# Altium schematic symbol library MCU_Microchip_ATmega.SchLib: 440 symbols (part 8 of 9) (continued)
## ATxmega64D4-A (continued)
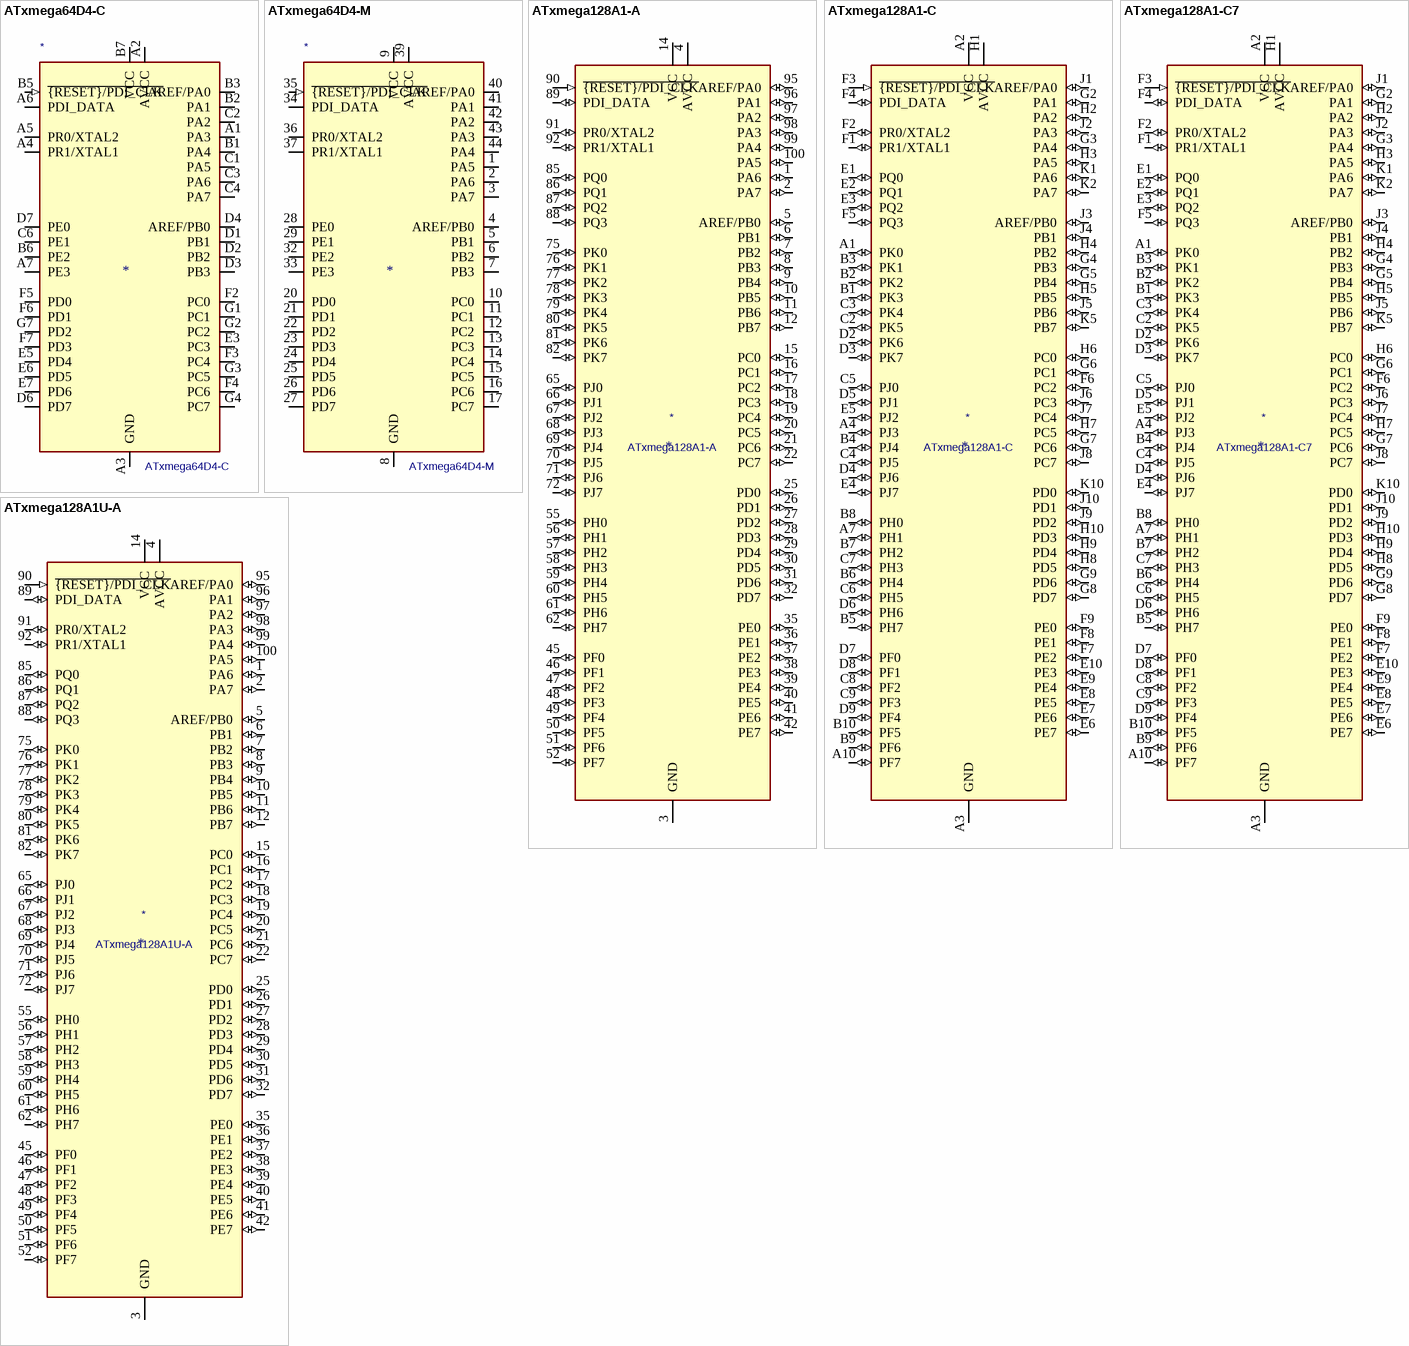
[diagram p35: symbols ATxmega64D4-C to ATxmega128A1U-A]

## ATxmega64D4-C
designator *  value ATxmega64D4-C
ki_keywords: AVR 8/16bit Microcontroller XMegaAVR; ki_description: 32MHz, 64kB Flash, 4kB Boot, 4kB SRAM, 2kB EEPROM, JTAG, VFBGA-49; ki_fp_filters: VFBGA*5.0x5.0mm*Layout7x7*P0.65mm*; Footprint: Package_BGA:VFBGA-49_5.0x5.0mm_Layout7x7_P0.65mm; Supplier: http://ww1.microchip.com/downloads/en/DeviceDoc/Atmel-8135-8-and-16-bit-AVR-microcontroller-ATxmega16D4-32D4-64D4-128D4_datasheet.pdf
footprint VFBGA-49_5.0x5.0mm_Layout7x7_P0.65mm
pins: A1 PA3 (io), A2 AVCC (power), A3 GND (power), A4 PR1/XTAL1 (io), A5 PR0/XTAL2 (io), A6 PDI_DATA (io), A7 PE3 (io), B1 PA4 (io), B2 PA1 (io), B3 AREF/PA0 (io), B4 GND hidden, B5 ~{{RESET}/PDI_CLK} (in), B6 PE2 (io), B7 VCC (power), C1 PA5 (io), C2 PA2 (io), C3 PA6 (io), C4 PA7 (io), C5 GND hidden, C6 PE1 (io), C7 GND hidden, D1 PB1 (io), D2 PB2 (io), D3 PB3 (io), D4 AREF/PB0 (io), D5 GND hidden, D6 PD7 (io), D7 PE0 (io), E1 GND hidden, E2 GND hidden, E3 PC3 (io), E4 GND hidden, E5 PD4 (io), E6 PD5 (io), E7 PD6 (io), F1 VCC hidden, F2 PC0 (io), F3 PC4 (io), F4 PC6 (io), F5 PD0 (io), F6 PD1 (io), F7 PD3 (io), G1 PC1 (io), G2 PC2 (io), G3 PC5 (io), G4 PC7 (io), G5 GND hidden, G6 VCC hidden, G7 PD2 (io)

## ATxmega64D4-M
designator *  value ATxmega64D4-M
ki_keywords: AVR 8/16bit Microcontroller XMegaAVR; ki_description: 32MHz, 64kB Flash, 4kB Boot, 4kB SRAM, 2kB EEPROM, JTAG, QFN-44; ki_fp_filters: QFN*1EP*7x7mm*P0.5mm*; Footprint: Package_DFN_QFN:QFN-44-1EP_7x7mm_P0.5mm_EP5.2x5.2mm; Supplier: http://ww1.microchip.com/downloads/en/DeviceDoc/Atmel-8135-8-and-16-bit-AVR-microcontroller-ATxmega16D4-32D4-64D4-128D4_datasheet.pdf
footprint QFN-44-1EP_7x7mm_P0.5mm_EP5.2x5.2mm
pins: 1 PA5 (io), 2 PA6 (io), 3 PA7 (io), 4 AREF/PB0 (io), 5 PB1 (io), 6 PB2 (io), 7 PB3 (io), 8 GND (power), 9 VCC (power), 10 PC0 (io), 11 PC1 (io), 12 PC2 (io), 13 PC3 (io), 14 PC4 (io), 15 PC5 (io), 16 PC6 (io), 17 PC7 (io), 18 GND hidden, 19 VCC hidden, 20 PD0 (io), 21 PD1 (io), 22 PD2 (io), 23 PD3 (io), 24 PD4 (io), 25 PD5 (io), 26 PD6 (io), 27 PD7 (io), 28 PE0 (io), 29 PE1 (io), 30 GND hidden, 31 VCC hidden, 32 PE2 (io), 33 PE3 (io), 34 PDI_DATA (io), 35 ~{{RESET}/PDI_CLK} (in), 36 PR0/XTAL2 (io), 37 PR1/XTAL1 (io), 38 GND hidden, 39 AVCC (power), 40 AREF/PA0 (io), 41 PA1 (io), 42 PA2 (io), 43 PA3 (io), 44 PA4 (io), 45 GND hidden

## ATxmega128A1-A
designator *  value ATxmega128A1-A
ki_keywords: AVR 8/16bit Microcontroller XMegaAVR; ki_description: 32MHz, 128kB Flash, 8kB Boot, 8kB SRAM, 2kB EEPROM, JTAG, TQFP-100; ki_fp_filters: TQFP*14x14mm*P0.5mm*; Footprint: Package_QFP:TQFP-100_14x14mm_P0.5mm; Supplier: http://ww1.microchip.com/downloads/en/DeviceDoc/Atmel-8067-8-and-16-bit-AVR-Microcontrollers-ATxmega64A1-ATxmega128A1_Datasheet.pdf
footprint TQFP-100_14x14mm_P0.5mm
pins: 1 PA6 (io), 2 PA7 (io), 3 GND (power), 4 AVCC (power), 5 AREF/PB0 (io), 6 PB1 (io), 7 PB2 (io), 8 PB3 (io), 9 PB4 (io), 10 PB5 (io), 11 PB6 (io), 12 PB7 (io), 13 GND hidden, 14 VCC (power), 15 PC0 (io), 16 PC1 (io), 17 PC2 (io), 18 PC3 (io), 19 PC4 (io), 20 PC5 (io), 21 PC6 (io), 22 PC7 (io), 23 GND hidden, 24 VCC hidden, 25 PD0 (io), 26 PD1 (io), 27 PD2 (io), 28 PD3 (io), 29 PD4 (io), 30 PD5 (io), 31 PD6 (io), 32 PD7 (io), 33 GND hidden, 34 VCC hidden, 35 PE0 (io), 36 PE1 (io), 37 PE2 (io), 38 PE3 (io), 39 PE4 (io), 40 PE5 (io), 41 PE6 (io), 42 PE7 (io), 43 GND hidden, 44 VCC hidden, 45 PF0 (io), 46 PF1 (io), 47 PF2 (io), 48 PF3 (io), 49 PF4 (io), 50 PF5 (io), 51 PF6 (io), 52 PF7 (io), 53 GND hidden, 54 VCC hidden, 55 PH0 (io), 56 PH1 (io), 57 PH2 (io), 58 PH3 (io), 59 PH4 (io), 60 PH5 (io), 61 PH6 (io), 62 PH7 (io), 63 GND hidden, 64 VCC hidden, 65 PJ0 (io), 66 PJ1 (io), 67 PJ2 (io), 68 PJ3 (io), 69 PJ4 (io), 70 PJ5 (io), 71 PJ6 (io), 72 PJ7 (io), 73 GND hidden, 74 VCC hidden, 75 PK0 (io), 76 PK1 (io), 77 PK2 (io), 78 PK3 (io), 79 PK4 (io), 80 PK5 (io), 81 PK6 (io), 82 PK7 (io), 83 VCC hidden, 84 GND hidden, 85 PQ0 (io), 86 PQ1 (io), 87 PQ2 (io), 88 PQ3 (io), 89 PDI_DATA (io), 90 ~{{RESET}/PDI_CLK} (in), 91 PR0/XTAL2 (io), 92 PR1/XTAL1 (io), 93 GND hidden, 94 AVCC hidden, 95 AREF/PA0 (io), 96 PA1 (io), 97 PA2 (io), 98 PA3 (io), 99 PA4 (io), 100 PA5 (io)

## ATxmega128A1-C
designator *  value ATxmega128A1-C
ki_keywords: AVR 8/16bit Microcontroller XMegaAVR; ki_description: 32MHz, 128kB Flash, 8kB Boot, 8kB SRAM, 2kB EEPROM, JTAG, TFBGA-100; ki_fp_filters: TFBGA*9.0x9.0mm*Layout10x10*P0.8mm*; Footprint: Package_BGA:TFBGA-100_9.0x9.0mm_Layout10x10_P0.8mm; Supplier: http://ww1.microchip.com/downloads/en/DeviceDoc/Atmel-8067-8-and-16-bit-AVR-Microcontrollers-ATxmega64A1-ATxmega128A1_Datasheet.pdf
footprint TFBGA-100_9.0x9.0mm_Layout10x10_P0.8mm
pins: A1 PK0 (io), A2 VCC (power), A3 GND (power), A4 PJ3 (io), A5 VCC hidden, A6 GND hidden, A7 PH1 (io), A8 GND hidden, A9 VCC hidden, A10 PF7 (io), B1 PK3 (io), B2 PK2 (io), B3 PK1 (io), B4 PJ4 (io), B5 PH7 (io), B6 PH4 (io), B7 PH2 (io), B8 PH0 (io), B9 PF6 (io), B10 PF5 (io), C1 VCC hidden, C2 PK5 (io), C3 PK4 (io), C4 PJ5 (io), C5 PJ0 (io), C6 PH5 (io), C7 PH3 (io), C8 PF2 (io), C9 PF3 (io), C10 VCC hidden, D1 GND hidden, D2 PK6 (io), D3 PK7 (io), D4 PJ6 (io), D5 PJ1 (io), D6 PH6 (io), D7 PF0 (io), D8 PF1 (io), D9 PF4 (io), D10 GND hidden, E1 PQ0 (io), E2 PQ1 (io), E3 PQ2 (io), E4 PJ7 (io), E5 PJ2 (io), E6 PE7 (io), E7 PE6 (io), E8 PE5 (io), E9 PE4 (io), E10 PE3 (io), F1 PR1/XTAL1 (io), F2 PR0/XTAL2 (io), F3 ~{{RESET}/PDI_CLK} (in), F4 PDI_DATA (io), F5 PQ3 (io), F6 PC2 (io), F7 PE2 (io), F8 PE1 (io), F9 PE0 (io), F10 VCC hidden, G1 GND hidden, G2 PA1 (io), G3 PA4 (io), G4 PB3 (io), G5 PB4 (io), G6 PC1 (io), G7 PC6 (io), G8 PD7 (io), G9 PD6 (io), G10 GND hidden, H1 AVCC (power), H2 PA2 (io), H3 PA5 (io), H4 PB2 (io), H5 PB5 (io), H6 PC0 (io), H7 PC5 (io), H8 PD5 (io), H9 PD4 (io), H10 PD3 (io), J1 AREF/PA0 (io), J2 PA3 (io), J3 AREF/PB0 (io), J4 PB1 (io), J5 PB6 (io), J6 PC3 (io), J7 PC4 (io), J8 PC7 (io), J9 PD2 (io), J10 PD1 (io), K1 PA6 (io), K2 PA7 (io), K3 GND hidden, K4 AVCC hidden, K5 PB7 (io), K6 VCC hidden, K7 GND hidden, K8 VCC hidden, K9 GND hidden, K10 PD0 (io)

## ATxmega128A1-C7
designator *  value ATxmega128A1-C7
ki_keywords: AVR 8/16bit Microcontroller XMegaAVR; ki_description: 32MHz, 128kB Flash, 8kB Boot, 8kB SRAM, 2kB EEPROM, JTAG, VFBGA-100; ki_fp_filters: VFBGA*7.0x7.0mm*Layout10x10*P0.65mm*; Footprint: Package_BGA:VFBGA-100_7.0x7.0mm_Layout10x10_P0.65mm; Supplier: http://ww1.microchip.com/downloads/en/DeviceDoc/Atmel-8067-8-and-16-bit-AVR-Microcontrollers-ATxmega64A1-ATxmega128A1_Datasheet.pdf
footprint VFBGA-100_7.0x7.0mm_Layout10x10_P0.65mm
pins: A1 PK0 (io), A2 VCC (power), A3 GND (power), A4 PJ3 (io), A5 VCC hidden, A6 GND hidden, A7 PH1 (io), A8 GND hidden, A9 VCC hidden, A10 PF7 (io), B1 PK3 (io), B2 PK2 (io), B3 PK1 (io), B4 PJ4 (io), B5 PH7 (io), B6 PH4 (io), B7 PH2 (io), B8 PH0 (io), B9 PF6 (io), B10 PF5 (io), C1 VCC hidden, C2 PK5 (io), C3 PK4 (io), C4 PJ5 (io), C5 PJ0 (io), C6 PH5 (io), C7 PH3 (io), C8 PF2 (io), C9 PF3 (io), C10 VCC hidden, D1 GND hidden, D2 PK6 (io), D3 PK7 (io), D4 PJ6 (io), D5 PJ1 (io), D6 PH6 (io), D7 PF0 (io), D8 PF1 (io), D9 PF4 (io), D10 GND hidden, E1 PQ0 (io), E2 PQ1 (io), E3 PQ2 (io), E4 PJ7 (io), E5 PJ2 (io), E6 PE7 (io), E7 PE6 (io), E8 PE5 (io), E9 PE4 (io), E10 PE3 (io), F1 PR1/XTAL1 (io), F2 PR0/XTAL2 (io), F3 ~{{RESET}/PDI_CLK} (in), F4 PDI_DATA (io), F5 PQ3 (io), F6 PC2 (io), F7 PE2 (io), F8 PE1 (io), F9 PE0 (io), F10 VCC hidden, G1 GND hidden, G2 PA1 (io), G3 PA4 (io), G4 PB3 (io), G5 PB4 (io), G6 PC1 (io), G7 PC6 (io), G8 PD7 (io), G9 PD6 (io), G10 GND hidden, H1 AVCC (power), H2 PA2 (io), H3 PA5 (io), H4 PB2 (io), H5 PB5 (io), H6 PC0 (io), H7 PC5 (io), H8 PD5 (io), H9 PD4 (io), H10 PD3 (io), J1 AREF/PA0 (io), J2 PA3 (io), J3 AREF/PB0 (io), J4 PB1 (io), J5 PB6 (io), J6 PC3 (io), J7 PC4 (io), J8 PC7 (io), J9 PD2 (io), J10 PD1 (io), K1 PA6 (io), K2 PA7 (io), K3 GND hidden, K4 AVCC hidden, K5 PB7 (io), K6 VCC hidden, K7 GND hidden, K8 VCC hidden, K9 GND hidden, K10 PD0 (io)

## ATxmega128A1U-A
designator *  value ATxmega128A1U-A
ki_keywords: AVR 8/16bit Microcontroller XMegaAVR; ki_description: 32MHz, 128kB Flash, 8kB Boot, 8kB SRAM, 2kB EEPROM, JTAG, USB, TQFP-100; ki_fp_filters: TQFP*14x14mm*P0.5mm*; Footprint: Package_QFP:TQFP-100_14x14mm_P0.5mm; Supplier: http://ww1.microchip.com/downloads/en/DeviceDoc/Atmel-8385-8-and-16-bit-AVR-Microcontroller-ATxmega64A1U-ATxmega128A1U_datasheet.pdf
footprint TQFP-100_14x14mm_P0.5mm
pins: 1 PA6 (io), 2 PA7 (io), 3 GND (power), 4 AVCC (power), 5 AREF/PB0 (io), 6 PB1 (io), 7 PB2 (io), 8 PB3 (io), 9 PB4 (io), 10 PB5 (io), 11 PB6 (io), 12 PB7 (io), 13 GND hidden, 14 VCC (power), 15 PC0 (io), 16 PC1 (io), 17 PC2 (io), 18 PC3 (io), 19 PC4 (io), 20 PC5 (io), 21 PC6 (io), 22 PC7 (io), 23 GND hidden, 24 VCC hidden, 25 PD0 (io), 26 PD1 (io), 27 PD2 (io), 28 PD3 (io), 29 PD4 (io), 30 PD5 (io), 31 PD6 (io), 32 PD7 (io), 33 GND hidden, 34 VCC hidden, 35 PE0 (io), 36 PE1 (io), 37 PE2 (io), 38 PE3 (io), 39 PE4 (io), 40 PE5 (io), 41 PE6 (io), 42 PE7 (io), 43 GND hidden, 44 VCC hidden, 45 PF0 (io), 46 PF1 (io), 47 PF2 (io), 48 PF3 (io), 49 PF4 (io), 50 PF5 (io), 51 PF6 (io), 52 PF7 (io), 53 GND hidden, 54 VCC hidden, 55 PH0 (io), 56 PH1 (io), 57 PH2 (io), 58 PH3 (io), 59 PH4 (io), 60 PH5 (io), 61 PH6 (io), 62 PH7 (io), 63 GND hidden, 64 VCC hidden, 65 PJ0 (io), 66 PJ1 (io), 67 PJ2 (io), 68 PJ3 (io), 69 PJ4 (io), 70 PJ5 (io), 71 PJ6 (io), 72 PJ7 (io), 73 GND hidden, 74 VCC hidden, 75 PK0 (io), 76 PK1 (io), 77 PK2 (io), 78 PK3 (io), 79 PK4 (io), 80 PK5 (io), 81 PK6 (io), 82 PK7 (io), 83 VCC hidden, 84 GND hidden, 85 PQ0 (io), 86 PQ1 (io), 87 PQ2 (io), 88 PQ3 (io), 89 PDI_DATA (io), 90 ~{{RESET}/PDI_CLK} (in), 91 PR0/XTAL2 (io), 92 PR1/XTAL1 (io), 93 GND hidden, 94 AVCC hidden, 95 AREF/PA0 (io), 96 PA1 (io), 97 PA2 (io), 98 PA3 (io), 99 PA4 (io), 100 PA5 (io)

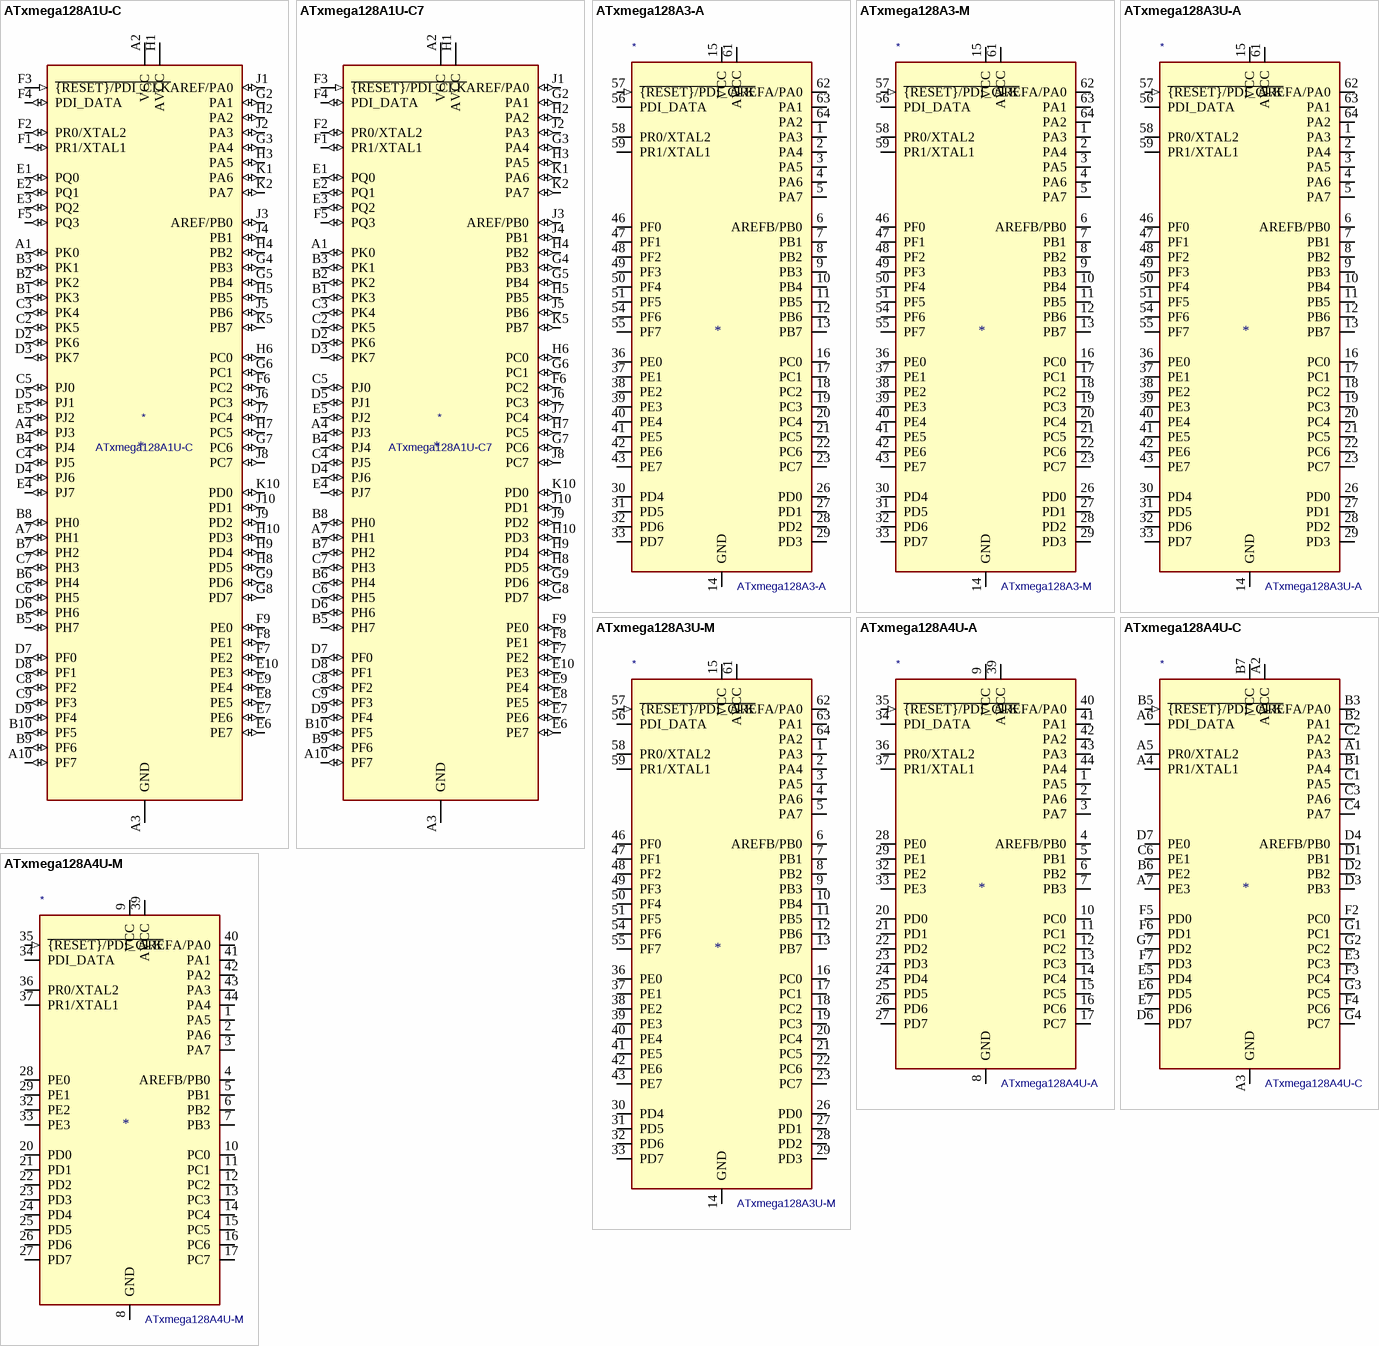
[diagram p36: symbols ATxmega128A1U-C to ATxmega128A4U-M]

## ATxmega128A1U-C
designator *  value ATxmega128A1U-C
ki_keywords: AVR 8/16bit Microcontroller XMegaAVR; ki_description: 32MHz, 128kB Flash, 8kB Boot, 8kB SRAM, 2kB EEPROM, JTAG, USB, TFBGA-100; ki_fp_filters: TFBGA*9.0x9.0mm*Layout10x10*P0.8mm*; Footprint: Package_BGA:TFBGA-100_9.0x9.0mm_Layout10x10_P0.8mm; Supplier: http://ww1.microchip.com/downloads/en/DeviceDoc/Atmel-8385-8-and-16-bit-AVR-Microcontroller-ATxmega64A1U-ATxmega128A1U_datasheet.pdf
footprint TFBGA-100_9.0x9.0mm_Layout10x10_P0.8mm
pins: A1 PK0 (io), A2 VCC (power), A3 GND (power), A4 PJ3 (io), A5 VCC hidden, A6 GND hidden, A7 PH1 (io), A8 GND hidden, A9 VCC hidden, A10 PF7 (io), B1 PK3 (io), B2 PK2 (io), B3 PK1 (io), B4 PJ4 (io), B5 PH7 (io), B6 PH4 (io), B7 PH2 (io), B8 PH0 (io), B9 PF6 (io), B10 PF5 (io), C1 VCC hidden, C2 PK5 (io), C3 PK4 (io), C4 PJ5 (io), C5 PJ0 (io), C6 PH5 (io), C7 PH3 (io), C8 PF2 (io), C9 PF3 (io), C10 VCC hidden, D1 GND hidden, D2 PK6 (io), D3 PK7 (io), D4 PJ6 (io), D5 PJ1 (io), D6 PH6 (io), D7 PF0 (io), D8 PF1 (io), D9 PF4 (io), D10 GND hidden, E1 PQ0 (io), E2 PQ1 (io), E3 PQ2 (io), E4 PJ7 (io), E5 PJ2 (io), E6 PE7 (io), E7 PE6 (io), E8 PE5 (io), E9 PE4 (io), E10 PE3 (io), F1 PR1/XTAL1 (io), F2 PR0/XTAL2 (io), F3 ~{{RESET}/PDI_CLK} (in), F4 PDI_DATA (io), F5 PQ3 (io), F6 PC2 (io), F7 PE2 (io), F8 PE1 (io), F9 PE0 (io), F10 VCC hidden, G1 GND hidden, G2 PA1 (io), G3 PA4 (io), G4 PB3 (io), G5 PB4 (io), G6 PC1 (io), G7 PC6 (io), G8 PD7 (io), G9 PD6 (io), G10 GND hidden, H1 AVCC (power), H2 PA2 (io), H3 PA5 (io), H4 PB2 (io), H5 PB5 (io), H6 PC0 (io), H7 PC5 (io), H8 PD5 (io), H9 PD4 (io), H10 PD3 (io), J1 AREF/PA0 (io), J2 PA3 (io), J3 AREF/PB0 (io), J4 PB1 (io), J5 PB6 (io), J6 PC3 (io), J7 PC4 (io), J8 PC7 (io), J9 PD2 (io), J10 PD1 (io), K1 PA6 (io), K2 PA7 (io), K3 GND hidden, K4 AVCC hidden, K5 PB7 (io), K6 VCC hidden, K7 GND hidden, K8 VCC hidden, K9 GND hidden, K10 PD0 (io)

## ATxmega128A1U-C7
designator *  value ATxmega128A1U-C7
ki_keywords: AVR 8/16bit Microcontroller XMegaAVR; ki_description: 32MHz, 128kB Flash, 8kB Boot, 8kB SRAM, 2kB EEPROM, JTAG, USB, VFBGA-100; ki_fp_filters: VFBGA*7.0x7.0mm*Layout10x10*P0.65mm*; Footprint: Package_BGA:VFBGA-100_7.0x7.0mm_Layout10x10_P0.65mm; Supplier: http://ww1.microchip.com/downloads/en/DeviceDoc/Atmel-8385-8-and-16-bit-AVR-Microcontroller-ATxmega64A1U-ATxmega128A1U_datasheet.pdf
footprint VFBGA-100_7.0x7.0mm_Layout10x10_P0.65mm
pins: A1 PK0 (io), A2 VCC (power), A3 GND (power), A4 PJ3 (io), A5 VCC hidden, A6 GND hidden, A7 PH1 (io), A8 GND hidden, A9 VCC hidden, A10 PF7 (io), B1 PK3 (io), B2 PK2 (io), B3 PK1 (io), B4 PJ4 (io), B5 PH7 (io), B6 PH4 (io), B7 PH2 (io), B8 PH0 (io), B9 PF6 (io), B10 PF5 (io), C1 VCC hidden, C2 PK5 (io), C3 PK4 (io), C4 PJ5 (io), C5 PJ0 (io), C6 PH5 (io), C7 PH3 (io), C8 PF2 (io), C9 PF3 (io), C10 VCC hidden, D1 GND hidden, D2 PK6 (io), D3 PK7 (io), D4 PJ6 (io), D5 PJ1 (io), D6 PH6 (io), D7 PF0 (io), D8 PF1 (io), D9 PF4 (io), D10 GND hidden, E1 PQ0 (io), E2 PQ1 (io), E3 PQ2 (io), E4 PJ7 (io), E5 PJ2 (io), E6 PE7 (io), E7 PE6 (io), E8 PE5 (io), E9 PE4 (io), E10 PE3 (io), F1 PR1/XTAL1 (io), F2 PR0/XTAL2 (io), F3 ~{{RESET}/PDI_CLK} (in), F4 PDI_DATA (io), F5 PQ3 (io), F6 PC2 (io), F7 PE2 (io), F8 PE1 (io), F9 PE0 (io), F10 VCC hidden, G1 GND hidden, G2 PA1 (io), G3 PA4 (io), G4 PB3 (io), G5 PB4 (io), G6 PC1 (io), G7 PC6 (io), G8 PD7 (io), G9 PD6 (io), G10 GND hidden, H1 AVCC (power), H2 PA2 (io), H3 PA5 (io), H4 PB2 (io), H5 PB5 (io), H6 PC0 (io), H7 PC5 (io), H8 PD5 (io), H9 PD4 (io), H10 PD3 (io), J1 AREF/PA0 (io), J2 PA3 (io), J3 AREF/PB0 (io), J4 PB1 (io), J5 PB6 (io), J6 PC3 (io), J7 PC4 (io), J8 PC7 (io), J9 PD2 (io), J10 PD1 (io), K1 PA6 (io), K2 PA7 (io), K3 GND hidden, K4 AVCC hidden, K5 PB7 (io), K6 VCC hidden, K7 GND hidden, K8 VCC hidden, K9 GND hidden, K10 PD0 (io)

## ATxmega128A3-A
designator *  value ATxmega128A3-A
ki_keywords: AVR 8/16bit Microcontroller XMegaAVR; ki_description: 32MHz, 128kB Flash, 8kB Boot, 8kB SRAM, 2kB EEPROM, JTAG, TQFP-64; ki_fp_filters: TQFP*14x14mm*P0.8mm*; Footprint: Package_QFP:TQFP-64_14x14mm_P0.8mm; Supplier: http://ww1.microchip.com/downloads/en/DeviceDoc/Atmel-8068-8-and16-bit-AVR-XMEGA-A3-Microcontrollers_Datasheet.pdf
footprint TQFP-64_14x14mm_P0.8mm
pins: 1 PA3 (io), 2 PA4 (io), 3 PA5 (io), 4 PA6 (io), 5 PA7 (io), 6 AREFB/PB0 (io), 7 PB1 (io), 8 PB2 (io), 9 PB3 (io), 10 PB4 (io), 11 PB5 (io), 12 PB6 (io), 13 PB7 (io), 14 GND (power), 15 VCC (power), 16 PC0 (io), 17 PC1 (io), 18 PC2 (io), 19 PC3 (io), 20 PC4 (io), 21 PC5 (io), 22 PC6 (io), 23 PC7 (io), 24 GND hidden, 25 VCC hidden, 26 PD0 (io), 27 PD1 (io), 28 PD2 (io), 29 PD3 (io), 30 PD4 (io), 31 PD5 (io), 32 PD6 (io), 33 PD7 (io), 34 GND hidden, 35 VCC hidden, 36 PE0 (io), 37 PE1 (io), 38 PE2 (io), 39 PE3 (io), 40 PE4 (io), 41 PE5 (io), 42 PE6 (io), 43 PE7 (io), 44 GND hidden, 45 VCC hidden, 46 PF0 (io), 47 PF1 (io), 48 PF2 (io), 49 PF3 (io), 50 PF4 (io), 51 PF5 (io), 52 GND hidden, 53 VCC hidden, 54 PF6 (io), 55 PF7 (io), 56 PDI_DATA (io), 57 ~{{RESET}/PDI_CLK} (in), 58 PR0/XTAL2 (io), 59 PR1/XTAL1 (io), 60 GND hidden, 61 AVCC (power), 62 AREFA/PA0 (io), 63 PA1 (io), 64 PA2 (io)

## ATxmega128A3-M
designator *  value ATxmega128A3-M
ki_keywords: AVR 8/16bit Microcontroller XMegaAVR; ki_description: 32MHz, 128kB Flash, 8kB Boot, 8kB SRAM, 2kB EEPROM, JTAG, QFN-64; ki_fp_filters: QFN*1EP*9x9mm*P0.5mm*; Footprint: Package_DFN_QFN:QFN-64-1EP_9x9mm_P0.5mm_EP7.65x7.65mm; Supplier: http://ww1.microchip.com/downloads/en/DeviceDoc/Atmel-8068-8-and16-bit-AVR-XMEGA-A3-Microcontrollers_Datasheet.pdf
footprint QFN-64-1EP_9x9mm_P0.5mm_EP7.65x7.65mm
pins: 1 PA3 (io), 2 PA4 (io), 3 PA5 (io), 4 PA6 (io), 5 PA7 (io), 6 AREFB/PB0 (io), 7 PB1 (io), 8 PB2 (io), 9 PB3 (io), 10 PB4 (io), 11 PB5 (io), 12 PB6 (io), 13 PB7 (io), 14 GND (power), 15 VCC (power), 16 PC0 (io), 17 PC1 (io), 18 PC2 (io), 19 PC3 (io), 20 PC4 (io), 21 PC5 (io), 22 PC6 (io), 23 PC7 (io), 24 GND hidden, 25 VCC hidden, 26 PD0 (io), 27 PD1 (io), 28 PD2 (io), 29 PD3 (io), 30 PD4 (io), 31 PD5 (io), 32 PD6 (io), 33 PD7 (io), 34 GND hidden, 35 VCC hidden, 36 PE0 (io), 37 PE1 (io), 38 PE2 (io), 39 PE3 (io), 40 PE4 (io), 41 PE5 (io), 42 PE6 (io), 43 PE7 (io), 44 GND hidden, 45 VCC hidden, 46 PF0 (io), 47 PF1 (io), 48 PF2 (io), 49 PF3 (io), 50 PF4 (io), 51 PF5 (io), 52 GND hidden, 53 VCC hidden, 54 PF6 (io), 55 PF7 (io), 56 PDI_DATA (io), 57 ~{{RESET}/PDI_CLK} (in), 58 PR0/XTAL2 (io), 59 PR1/XTAL1 (io), 60 GND hidden, 61 AVCC (power), 62 AREFA/PA0 (io), 63 PA1 (io), 64 PA2 (io), 65 GND hidden

## ATxmega128A3U-A
designator *  value ATxmega128A3U-A
ki_keywords: AVR 8/16bit Microcontroller XMegaAVR; ki_description: 32MHz, 128kB Flash, 8kB Boot, 8kB SRAM, 2kB EEPROM, JTAG, USB, TQFP-64; ki_fp_filters: TQFP*14x14mm*P0.8mm*; Footprint: Package_QFP:TQFP-64_14x14mm_P0.8mm; Supplier: http://ww1.microchip.com/downloads/en/DeviceDoc/Atmel-8386-8-and-16-bit-AVR-Microcontroller-ATxmega64A3U-128A3U-192A3U-256A3U_datasheet.pdf
footprint TQFP-64_14x14mm_P0.8mm
pins: 1 PA3 (io), 2 PA4 (io), 3 PA5 (io), 4 PA6 (io), 5 PA7 (io), 6 AREFB/PB0 (io), 7 PB1 (io), 8 PB2 (io), 9 PB3 (io), 10 PB4 (io), 11 PB5 (io), 12 PB6 (io), 13 PB7 (io), 14 GND (power), 15 VCC (power), 16 PC0 (io), 17 PC1 (io), 18 PC2 (io), 19 PC3 (io), 20 PC4 (io), 21 PC5 (io), 22 PC6 (io), 23 PC7 (io), 24 GND hidden, 25 VCC hidden, 26 PD0 (io), 27 PD1 (io), 28 PD2 (io), 29 PD3 (io), 30 PD4 (io), 31 PD5 (io), 32 PD6 (io), 33 PD7 (io), 34 GND hidden, 35 VCC hidden, 36 PE0 (io), 37 PE1 (io), 38 PE2 (io), 39 PE3 (io), 40 PE4 (io), 41 PE5 (io), 42 PE6 (io), 43 PE7 (io), 44 GND hidden, 45 VCC hidden, 46 PF0 (io), 47 PF1 (io), 48 PF2 (io), 49 PF3 (io), 50 PF4 (io), 51 PF5 (io), 52 GND hidden, 53 VCC hidden, 54 PF6 (io), 55 PF7 (io), 56 PDI_DATA (io), 57 ~{{RESET}/PDI_CLK} (in), 58 PR0/XTAL2 (io), 59 PR1/XTAL1 (io), 60 GND hidden, 61 AVCC (power), 62 AREFA/PA0 (io), 63 PA1 (io), 64 PA2 (io)

## ATxmega128A3U-M
designator *  value ATxmega128A3U-M
ki_keywords: AVR 8/16bit Microcontroller XMegaAVR; ki_description: 32MHz, 128kB Flash, 8kB Boot, 8kB SRAM, 2kB EEPROM, JTAG, USB, QFN-64; ki_fp_filters: QFN*1EP*9x9mm*P0.5mm*; Footprint: Package_DFN_QFN:QFN-64-1EP_9x9mm_P0.5mm_EP7.65x7.65mm; Supplier: http://ww1.microchip.com/downloads/en/DeviceDoc/Atmel-8386-8-and-16-bit-AVR-Microcontroller-ATxmega64A3U-128A3U-192A3U-256A3U_datasheet.pdf
footprint QFN-64-1EP_9x9mm_P0.5mm_EP7.65x7.65mm
pins: 1 PA3 (io), 2 PA4 (io), 3 PA5 (io), 4 PA6 (io), 5 PA7 (io), 6 AREFB/PB0 (io), 7 PB1 (io), 8 PB2 (io), 9 PB3 (io), 10 PB4 (io), 11 PB5 (io), 12 PB6 (io), 13 PB7 (io), 14 GND (power), 15 VCC (power), 16 PC0 (io), 17 PC1 (io), 18 PC2 (io), 19 PC3 (io), 20 PC4 (io), 21 PC5 (io), 22 PC6 (io), 23 PC7 (io), 24 GND hidden, 25 VCC hidden, 26 PD0 (io), 27 PD1 (io), 28 PD2 (io), 29 PD3 (io), 30 PD4 (io), 31 PD5 (io), 32 PD6 (io), 33 PD7 (io), 34 GND hidden, 35 VCC hidden, 36 PE0 (io), 37 PE1 (io), 38 PE2 (io), 39 PE3 (io), 40 PE4 (io), 41 PE5 (io), 42 PE6 (io), 43 PE7 (io), 44 GND hidden, 45 VCC hidden, 46 PF0 (io), 47 PF1 (io), 48 PF2 (io), 49 PF3 (io), 50 PF4 (io), 51 PF5 (io), 52 GND hidden, 53 VCC hidden, 54 PF6 (io), 55 PF7 (io), 56 PDI_DATA (io), 57 ~{{RESET}/PDI_CLK} (in), 58 PR0/XTAL2 (io), 59 PR1/XTAL1 (io), 60 GND hidden, 61 AVCC (power), 62 AREFA/PA0 (io), 63 PA1 (io), 64 PA2 (io), 65 GND hidden

## ATxmega128A4U-A
designator *  value ATxmega128A4U-A
ki_keywords: AVR 8/16bit Microcontroller XMegaAVR; ki_description: 32MHz, 128kB Flash, 8kB Boot, 8kB SRAM, 2kB EEPROM, JTAG, USB, TQFP-44; ki_fp_filters: TQFP*10x10mm*P0.8mm*; Footprint: Package_QFP:TQFP-44_10x10mm_P0.8mm; Supplier: http://ww1.microchip.com/downloads/en/DeviceDoc/Atmel-8387-8-and16-bit-AVR-Microcontroller-XMEGA-A4U_Datasheet.pdf
footprint TQFP-44_10x10mm_P0.8mm
pins: 1 PA5 (io), 2 PA6 (io), 3 PA7 (io), 4 AREFB/PB0 (io), 5 PB1 (io), 6 PB2 (io), 7 PB3 (io), 8 GND (power), 9 VCC (power), 10 PC0 (io), 11 PC1 (io), 12 PC2 (io), 13 PC3 (io), 14 PC4 (io), 15 PC5 (io), 16 PC6 (io), 17 PC7 (io), 18 GND hidden, 19 VCC hidden, 20 PD0 (io), 21 PD1 (io), 22 PD2 (io), 23 PD3 (io), 24 PD4 (io), 25 PD5 (io), 26 PD6 (io), 27 PD7 (io), 28 PE0 (io), 29 PE1 (io), 30 GND hidden, 31 VCC hidden, 32 PE2 (io), 33 PE3 (io), 34 PDI_DATA (io), 35 ~{{RESET}/PDI_CLK} (in), 36 PR0/XTAL2 (io), 37 PR1/XTAL1 (io), 38 GND hidden, 39 AVCC (power), 40 AREFA/PA0 (io), 41 PA1 (io), 42 PA2 (io), 43 PA3 (io), 44 PA4 (io)

## ATxmega128A4U-C
designator *  value ATxmega128A4U-C
ki_keywords: AVR 8/16bit Microcontroller XMegaAVR; ki_description: 32MHz, 128kB Flash, 8kB Boot, 8kB SRAM, 2kB EEPROM, JTAG, USB, VFBGA-49; ki_fp_filters: VFBGA*5.0x5.0mm*Layout7x7*P0.65mm*; Footprint: Package_BGA:VFBGA-49_5.0x5.0mm_Layout7x7_P0.65mm; Supplier: http://ww1.microchip.com/downloads/en/DeviceDoc/Atmel-8387-8-and16-bit-AVR-Microcontroller-XMEGA-A4U_Datasheet.pdf
footprint VFBGA-49_5.0x5.0mm_Layout7x7_P0.65mm
pins: A1 PA3 (io), A2 AVCC (power), A3 GND (power), A4 PR1/XTAL1 (io), A5 PR0/XTAL2 (io), A6 PDI_DATA (io), A7 PE3 (io), B1 PA4 (io), B2 PA1 (io), B3 AREFA/PA0 (io), B4 GND hidden, B5 ~{{RESET}/PDI_CLK} (in), B6 PE2 (io), B7 VCC (power), C1 PA5 (io), C2 PA2 (io), C3 PA6 (io), C4 PA7 (io), C5 GND hidden, C6 PE1 (io), C7 GND hidden, D1 PB1 (io), D2 PB2 (io), D3 PB3 (io), D4 AREFB/PB0 (io), D5 GND hidden, D6 PD7 (io), D7 PE0 (io), E1 GND hidden, E2 GND hidden, E3 PC3 (io), E4 GND hidden, E5 PD4 (io), E6 PD5 (io), E7 PD6 (io), F1 VCC hidden, F2 PC0 (io), F3 PC4 (io), F4 PC6 (io), F5 PD0 (io), F6 PD1 (io), F7 PD3 (io), G1 PC1 (io), G2 PC2 (io), G3 PC5 (io), G4 PC7 (io), G5 GND hidden, G6 VCC hidden, G7 PD2 (io)

## ATxmega128A4U-M
designator *  value ATxmega128A4U-M
ki_keywords: AVR 8/16bit Microcontroller XMegaAVR; ki_description: 32MHz, 128kB Flash, 8kB Boot, 8kB SRAM, 2kB EEPROM, JTAG, USB, QFN-44; ki_fp_filters: QFN*1EP*7x7mm*P0.5mm*; Footprint: Package_DFN_QFN:QFN-44-1EP_7x7mm_P0.5mm_EP5.2x5.2mm; Supplier: http://ww1.microchip.com/downloads/en/DeviceDoc/Atmel-8387-8-and16-bit-AVR-Microcontroller-XMEGA-A4U_Datasheet.pdf
footprint QFN-44-1EP_7x7mm_P0.5mm_EP5.2x5.2mm
pins: 1 PA5 (io), 2 PA6 (io), 3 PA7 (io), 4 AREFB/PB0 (io), 5 PB1 (io), 6 PB2 (io), 7 PB3 (io), 8 GND (power), 9 VCC (power), 10 PC0 (io), 11 PC1 (io), 12 PC2 (io), 13 PC3 (io), 14 PC4 (io), 15 PC5 (io), 16 PC6 (io), 17 PC7 (io), 18 GND hidden, 19 VCC hidden, 20 PD0 (io), 21 PD1 (io), 22 PD2 (io), 23 PD3 (io), 24 PD4 (io), 25 PD5 (io), 26 PD6 (io), 27 PD7 (io), 28 PE0 (io), 29 PE1 (io), 30 GND hidden, 31 VCC hidden, 32 PE2 (io), 33 PE3 (io), 34 PDI_DATA (io), 35 ~{{RESET}/PDI_CLK} (in), 36 PR0/XTAL2 (io), 37 PR1/XTAL1 (io), 38 GND hidden, 39 AVCC (power), 40 AREFA/PA0 (io), 41 PA1 (io), 42 PA2 (io), 43 PA3 (io), 44 PA4 (io), 45 GND hidden

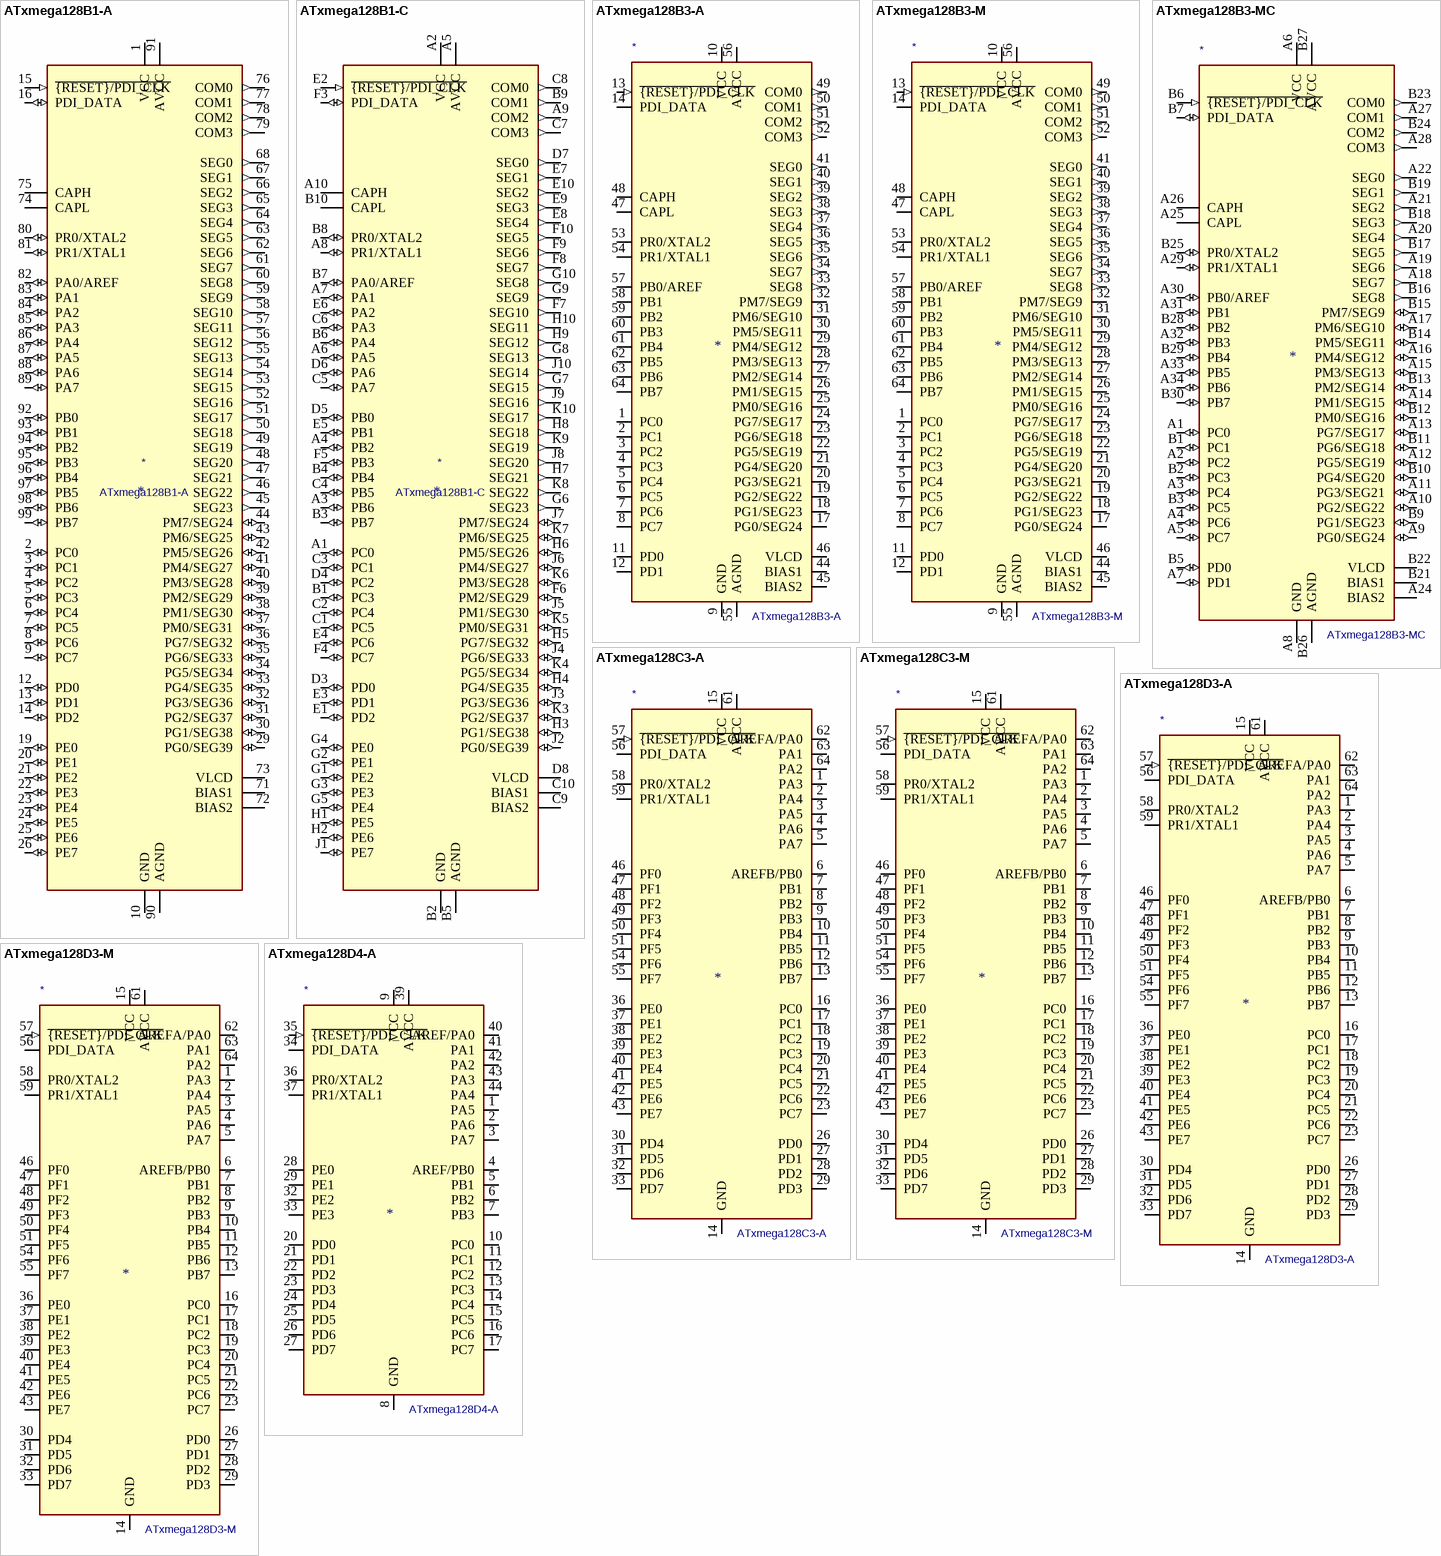
[diagram p37: symbols ATxmega128B1-A to ATxmega128D4-A]

## ATxmega128B1-A
designator *  value ATxmega128B1-A
ki_keywords: AVR 8/16bit Microcontroller XMegaAVR; ki_description: 32MHz, 128kB Flash, 8kB Boot, 8kB SRAM, 2kB EEPROM, JTAG, USB, LCD, TQFP-100; ki_fp_filters: TQFP*14x14mm*P0.5mm*; Footprint: Package_QFP:TQFP-100_14x14mm_P0.5mm; Supplier: http://ww1.microchip.com/downloads/en/DeviceDoc/Atmel-8330-8-and-16-bit-AVR-Microcontroller-XMEGA-B-ATxmega64B1-ATxmega128B1_Datasheet.pdf
footprint TQFP-100_14x14mm_P0.5mm
pins: 1 VCC (power), 2 PC0 (io), 3 PC1 (io), 4 PC2 (io), 5 PC3 (io), 6 PC4 (io), 7 PC5 (io), 8 PC6 (io), 9 PC7 (io), 10 GND (power), 11 VCC hidden, 12 PD0 (io), 13 PD1 (io), 14 PD2 (io), 15 ~{{RESET}/PDI_CLK} (in), 16 PDI_DATA (io), 17 GND hidden, 18 VCC hidden, 19 PE0 (io), 20 PE1 (io), 21 PE2 (io), 22 PE3 (io), 23 PE4 (io), 24 PE5 (io), 25 PE6 (io), 26 PE7 (io), 27 GND hidden, 28 VCC hidden, 29 PG0/SEG39 (io), 30 PG1/SEG38 (io), 31 PG2/SEG37 (io), 32 PG3/SEG36 (io), 33 PG4/SEG35 (io), 34 PG5/SEG34 (io), 35 PG6/SEG33 (io), 36 PG7/SEG32 (io), 37 PM0/SEG31 (io), 38 PM1/SEG30 (io), 39 PM2/SEG29 (io), 40 PM3/SEG28 (io), 41 PM4/SEG27 (io), 42 PM5/SEG26 (io), 43 PM6/SEG25 (io), 44 PM7/SEG24 (io), 45 SEG23 (out), 46 SEG22 (out), 47 SEG21 (out), 48 SEG20 (out), 49 SEG19 (out), 50 SEG18 (out), 51 SEG17 (out), 52 SEG16 (out), 53 SEG15 (out), 54 SEG14 (out), 55 SEG13 (out), 56 SEG12 (out), 57 SEG11 (out), 58 SEG10 (out), 59 SEG9 (out), 60 SEG8 (out), 61 SEG7 (out), 62 SEG6 (out), 63 SEG5 (out), 64 SEG4 (out), 65 SEG3 (out), 66 SEG2 (out), 67 SEG1 (out), 68 SEG0 (out), 69 GND hidden, 70 VCC hidden, 71 BIAS1 (power), 72 BIAS2 (power), 73 VLCD (power), 74 CAPL, 75 CAPH, 76 COM0 (out), 77 COM1 (out), 78 COM2 (out), 79 COM3 (out), 80 PR0/XTAL2 (io), 81 PR1/XTAL1 (io), 82 PA0/AREF (io), 83 PA1 (io), 84 PA2 (io), 85 PA3 (io), 86 PA4 (io), 87 PA5 (io), 88 PA6 (io), 89 PA7 (io), 90 AGND (power), 91 AVCC (power), 92 PB0 (io), 93 PB1 (io), 94 PB2 (io), 95 PB3 (io), 96 PB4 (io), 97 PB5 (io), 98 PB6 (io), 99 PB7 (io), 100 GND hidden

## ATxmega128B1-C
designator *  value ATxmega128B1-C
ki_keywords: AVR 8/16bit Microcontroller XMegaAVR; ki_description: 32MHz, 128kB Flash, 8kB Boot, 8kB SRAM, 2kB EEPROM, JTAG, USB, LCD, VFBGA-100; ki_fp_filters: VFBGA*7.0x7.0mm*Layout10x10*P0.65mm*; Footprint: Package_BGA:VFBGA-100_7.0x7.0mm_Layout10x10_P0.65mm; Supplier: http://ww1.microchip.com/downloads/en/DeviceDoc/Atmel-8330-8-and-16-bit-AVR-Microcontroller-XMEGA-B-ATxmega64B1-ATxmega128B1_Datasheet.pdf
footprint VFBGA-100_7.0x7.0mm_Layout10x10_P0.65mm
pins: A1 PC0 (io), A2 VCC (power), A3 PB6 (io), A4 PB2 (io), A5 AVCC (power), A6 PA5 (io), A7 PA1 (io), A8 PR1/XTAL1 (io), A9 COM2 (out), A10 CAPH, B1 PC3 (io), B2 GND (power), B3 PB7 (io), B4 PB4 (io), B5 AGND (power), B6 PA4 (io), B7 PA0/AREF (io), B8 PR0/XTAL2 (io), B9 COM1 (out), B10 CAPL, C1 PC5 (io), C2 PC4 (io), C3 PC1 (io), C4 PB5 (io), C5 PA7 (io), C6 PA3 (io), C7 COM3 (out), C8 COM0 (out), C9 BIAS2 (power), C10 BIAS1 (power), D1 VCC hidden, D2 GND hidden, D3 PD0 (io), D4 PC2 (io), D5 PB0 (io), D6 PA6 (io), D7 SEG0 (out), D8 VLCD (power), D9 GND hidden, D10 VCC hidden, E1 PD2 (io), E2 ~{{RESET}/PDI_CLK} (in), E3 PD1 (io), E4 PC6 (io), E5 PB1 (io), E6 PA2 (io), E7 SEG1 (out), E8 SEG4 (out), E9 SEG3 (out), E10 SEG2 (out), F1 VCC hidden, F2 GND hidden, F3 PDI_DATA (io), F4 PC7 (io), F5 PB3 (io), F6 PM2/SEG29 (io), F7 SEG10 (out), F8 SEG7 (out), F9 SEG6 (out), F10 SEG5 (out), G1 PE2 (io), G2 PE1 (io), G3 PE3 (io), G4 PE0 (io), G5 PE4 (io), G6 SEG23 (out), G7 SEG15 (out), G8 SEG13 (out), G9 SEG9 (out), G10 SEG8 (out), H1 PE5 (io), H2 PE6 (io), H3 PG1/SEG38 (io), H4 PG4/SEG35 (io), H5 PG7/SEG32 (io), H6 PM5/SEG26 (io), H7 SEG21 (out), H8 SEG18 (out), H9 SEG12 (out), H10 SEG11 (out), J1 PE7 (io), J2 PG0/SEG39 (io), J3 PG3/SEG36 (io), J4 PG6/SEG33 (io), J5 PM1/SEG30 (io), J6 PM4/SEG27 (io), J7 PM7/SEG24 (io), J8 SEG20 (out), J9 SEG16 (out), J10 SEG14 (out), K1 GND hidden, K2 VCC hidden, K3 PG2/SEG37 (io), K4 PG5/SEG34 (io), K5 PM0/SEG31 (io), K6 PM3/SEG28 (io), K7 PM6/SEG25 (io), K8 SEG22 (out), K9 SEG19 (out), K10 SEG17 (out)